# Altium footprint library ESP32-SIM800C_KIEN.PcbLib: 45 footprints (part 2 of 3)
Each footprint in its own frame and in the unit in brackets; x right, y up, seen from the top. Pads: shape width x height; smd on the part's side, far side on the other; paste and mask are expansions set on the pad; w line width, h text height; cw(c..) or ccw(c..) is an arc to the next point about the centre after c.
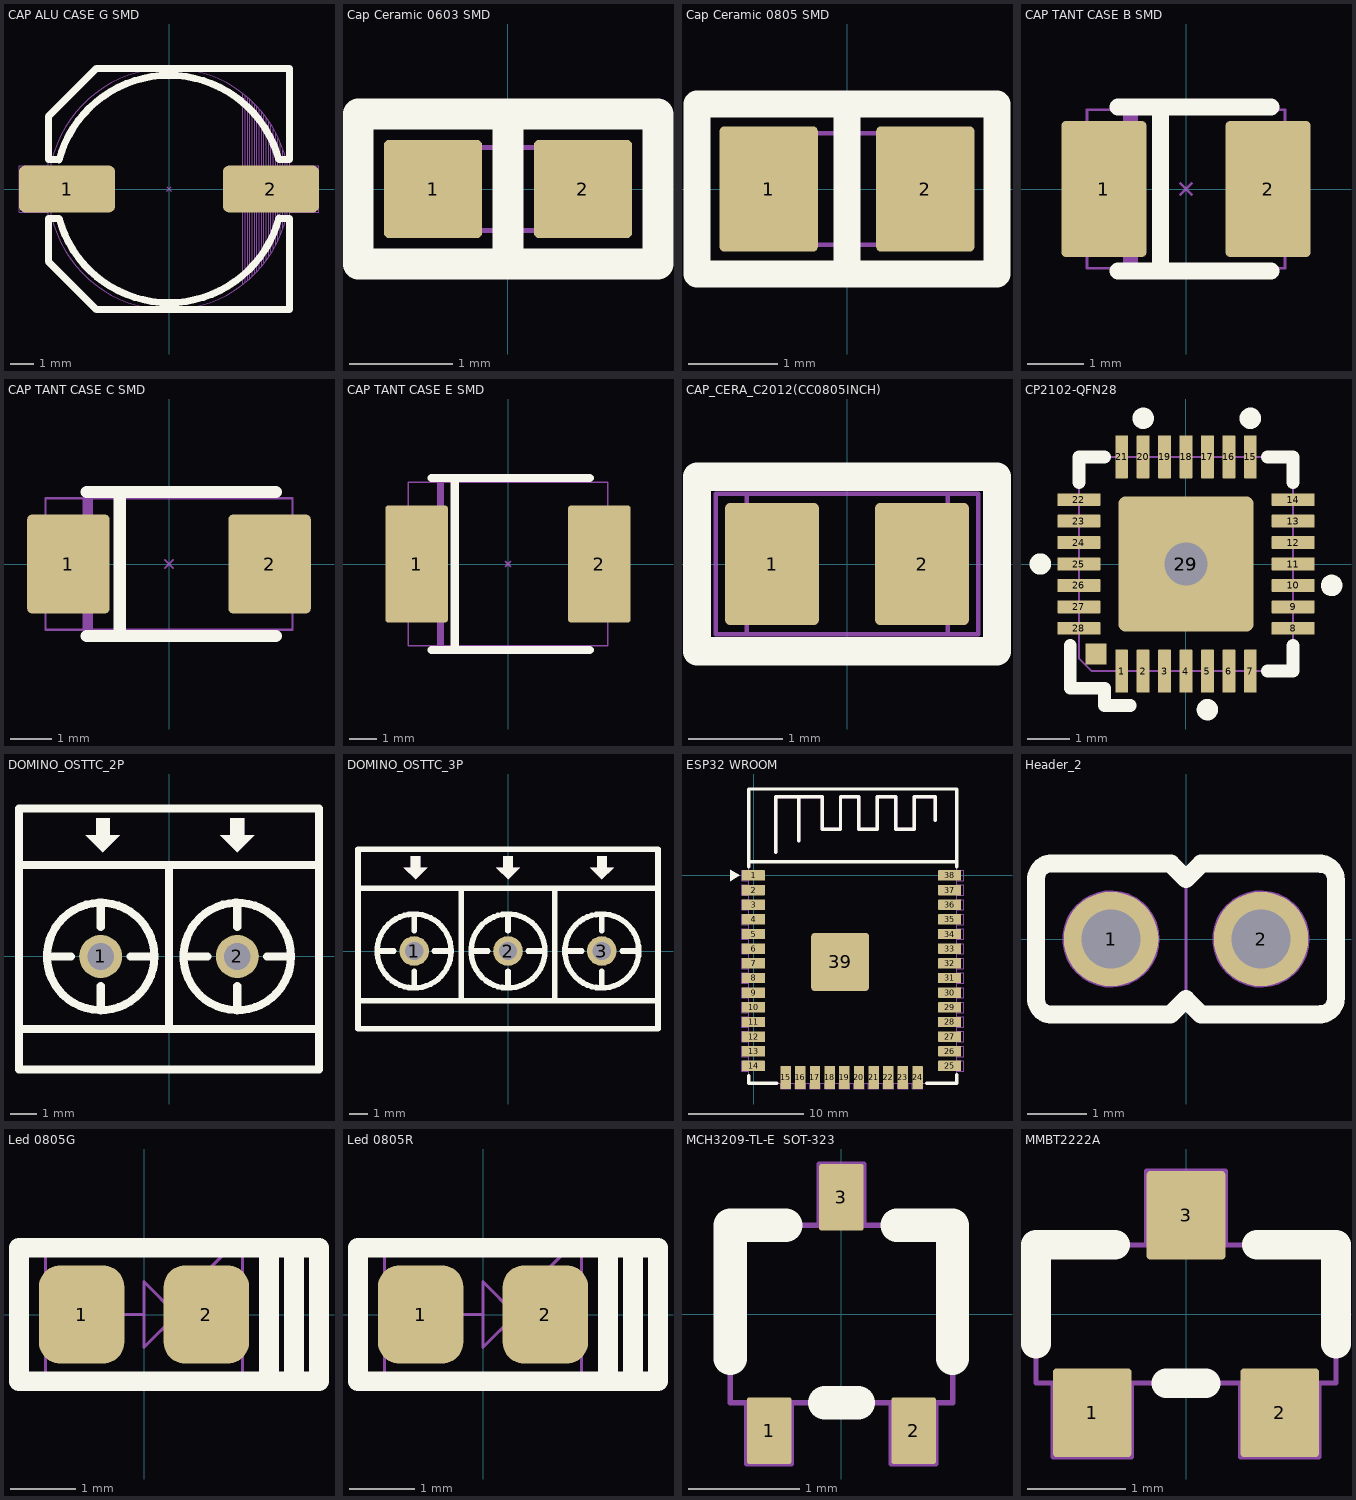
[diagram p1: the footprints below, top view; thin cyan lines are the x and y axes]

## CAP ALU CASE G SMD [mm]
pads (2):
  rrect25% 4.1x2 smd mask+0.05: 1(-4.35,0) 2(4.35,0)
Top Overlay:
  lines w0.3: -4.688,-1.25 -5.15,-1.25 -5.15,-3.1 -3.1,-5.15 5.15,-5.15 5.15,-1.25 4.688,-1.25 ; -4.688,1.25 -5.15,1.25 -5.15,3.1 -3.1,5.15 5.15,5.15 5.15,1.25 4.688,1.25 ; -4.687,1.248 cw(c0,0) 4.685,1.252 ; -4.685,-1.252 ccw(c0,0) 4.687,-1.248
Mechanical 2:
  circle w0.05: c0,0 r5.15
  lines w0.05: -5.95,0 -5.65,0 ; -5.8,-0.15 -5.8,0.15 ; -5.15,-1 -6.4,-1 -6.4,1 -5.15,1 ; -0.1,-0.1 0.1,0.1 ; -0.1,0.1 0.1,-0.1 ; 3.15,-4.05 3.15,4.05 ; 3.25,-3.95 3.25,3.95 ; 3.35,-3.9 3.35,3.9 ; 3.45,-3.8 3.45,3.8 ; 3.55,-3.7 3.55,3.7 ; 3.65,-3.6 3.65,3.6 ; 3.75,-3.5 3.75,3.5 ; 3.85,-3.4 3.85,3.4 ; 3.95,-3.3 3.95,3.3 ; 4.05,-3.15 4.05,3.15 ; 4.15,-3.05 4.15,3.05 ; 4.25,-2.9 4.25,2.9 ; 4.35,-2.7 4.35,2.75 ; 4.45,-2.55 4.45,2.55 ; 4.55,-2.4 4.55,2.35 ; 4.65,-2.2 4.65,2.15 ; 4.75,-1.95 4.75,1.95 ; 4.85,-1.7 4.85,1.65 ; 4.95,-1.35 4.95,1.35 ; 5.05,-0.9 5.05,0.85 ; 5.15,-1 6.4,-1 6.4,1 5.15,1 ; -5.15,-3.1 -5.15,3.1 -3.1,5.15 5.15,5.15 5.15,-5.15 -3.1,-5.15 -5.15,-3.1
  text ".Designator" at 0,0.1 h0.75
3D body "User Library-ALU-G.STEP": height 10.2, standoff 0, extent -5.8,-5.15 5.8,5.15
3D body "User Library-ALU-G.STEP": height 10.2, standoff 0, extent -5.72,-5.149 5.88,5.151

## Cap Ceramic 0603 SMD [mm] "Reflow Soldering"
pads (2):
  rrect10% 0.95x0.95 smd mask+0.05: 1(-0.725,0) 2(0.725,0)
Top Overlay:
  lines w0.3: -1.45,0.725 -1.45,-0.725 1.435,-0.725 ; -1.435,0.725 1.435,0.725 ; 0,-0.725 0,0.725 ; 1.45,-0.725 1.45,0.725
Mechanical 2:
  lines w0.05: -0.1,-0.1 0.1,0.1 ; -0.1,0.1 0.1,-0.1 ; -0.8,-0.4 0.8,-0.4 0.8,0.4 -0.8,0.4 -0.8,-0.4
  text ".Designator" at 0,0 h0.75
3D body "User Library-SMD CAPACITOR0603.STEP": height 0.85, standoff 0.05, extent -0.8,-0.4 0.8,0.4

## Cap Ceramic 0805 SMD [mm] "Reflow Soldering"
pads (2):
  rrect10% 1.1x1.4 smd mask+0.05: 1(-0.875,0) 2(0.875,0)
Top Overlay:
  lines w0.3: 0,-0.95 0,0.95 ; -1.675,-0.95 -1.675,0.95 1.675,0.95 1.675,-0.95 -1.675,-0.95
Mechanical 2:
  lines w0.05: -0.1,-0.1 0.1,0.1 ; -0.1,0.1 0.1,-0.1 ; -1,-0.625 1,-0.625 1,0.625 -1,0.625 -1,-0.625
  text ".Designator" at 0,0 h0.75
3D body "User Library-SMD CAPACITOR0805.STEP": height 0.65, standoff 0.05, extent -1,-0.625 1,0.625

## CAP TANT CASE B SMD [mm] "35x28mm"
height 2.1
pads (2):
  rrect10% 1.5x2.4 smd mask+0.05: 1(-1.45,0) 2(1.45,0)
Top Overlay:
  lines w0.3: -1.2,-1.45 1.5,-1.45 ; -1.2,1.45 1.5,1.45 ; -0.45,-1.45 -0.45,1.45
Mechanical 2:
  rectangle: -1.11,-1.4 -0.85,1.4
  lines w0.05: -1.5,0 -1.2,0 ; -1.35,-0.15 -1.35,0.15 ; -0.1,-0.1 0.1,0.1 ; -0.1,0.1 0.1,-0.1 ; -1.75,-1.4 1.75,-1.4 1.75,1.4 -1.75,1.4 -1.75,-1.4
  text ".Designator" at -0.1,0.1 h0.75
3D body "User Library-CaseB_3528-21.STEP": height 2, standoff 0.1, extent -1.75,-1.4 1.75,1.4

## CAP TANT CASE C SMD [mm] "60x32mm"
height 2.8
pads (2):
  rrect10% 2x2.4 smd mask+0.05: 1(-2.45,0) 2(2.45,0)
Top Overlay:
  lines w0.3: -2,-1.752 2.6,-1.752 ; -2,1.752 2.6,1.752 ; -1.2,-1.752 -1.2,1.752
Mechanical 2:
  rectangle: -2.11,-1.6 -1.85,1.6
  lines w0.05: -2.67,0 -2.37,0 ; -2.52,-0.15 -2.52,0.15 ; -0.1,-0.1 0.1,0.1 ; -0.1,0.1 0.1,-0.1 ; -3,-1.6 -3,1.6 3,1.6 3,-1.6 -3,-1.6
  text ".Designator" at -0.1,-0.1 h0.75
3D body "User Library-CaseC_6032-28.STEP": height 2.6, standoff 0.1, extent -2.995,-1.601 3.005,1.599

## CAP TANT CASE E SMD [mm] "73x60"
height 4.1
pads (2):
  rrect10% 2.3x4.3 smd mask+0.05: 1(-3.35,0) 2(3.35,0)
Top Overlay:
  lines w0.3: -2.8,-3.15 3,-3.15 ; -2.8,3.15 3,3.15 ; -1.95,-3.15 -1.95,3.15
Mechanical 2:
  rectangle: -2.61,-3 -2.35,3
  lines w0.05: -3.2,0 -2.9,0 ; -3.05,-0.15 -3.05,0.15 ; -0.1,-0.1 0.1,0.1 ; -0.1,0.1 0.1,-0.1 ; -3.65,-3 3.65,-3 3.65,3 -3.65,3 -3.65,-3
  text ".Designator" at 0,0 h0.75
3D body "User Library-CaseE_7260-38.STEP": height 3.6, standoff 0, extent -3.65,-3 3.65,3

## CAP_CERA_C2012(CC0805INCH) [mm] "Chip Capacitor, 2-Leads, Body 2.0x1.3mm, IPC Medium Density"
height 1.45
pads (2):
  rrect10% 1x1.3 smd mask+0.05: 1(-0.8,0) 2(0.8,0)
Top Overlay:
  lines w0.3: -1.6,-0.93 1.6,-0.93 1.6,0.93 -1.6,0.93 -1.6,-0.93
Mechanical 2:
  lines w0.05: -1.07,-0.74 -1.07,0.75 ; 1.075,-0.74 1.075,0.75 ; -1.4,-0.75 1.4,-0.75 1.4,0.75 -1.4,0.75 -1.4,-0.75
3D body "User Library-cap_0805_lowprofile.step": height 0.95, standoff 0, extent -1,-0.6 1,0.6

## CP2102-QFN28 [mm] "QFN28 5x5 pitch 0.5"
height 1
pads (31):
  rrect10% 0.3x1 smd mask+0.05: 1(-1.5,-2.5) 2(-1,-2.5) 3(-0.5,-2.5) 4(0,-2.5) 5(0.5,-2.5) 6(1,-2.5) 7(1.5,-2.5) 15(1.5,2.5) 16(1,2.5) 17(0.5,2.5) 18(0,2.5) 19(-0.5,2.5) 20(-1,2.5) 21(-1.5,2.5)
  rrect10% 1x0.3 smd mask+0.05: 8(2.5,-1.5) 9(2.5,-1) 10(2.5,-0.5) 11(2.5,0) 12(2.5,0.5) 13(2.5,1) 14(2.5,1.5) 22(-2.5,1.5) 23(-2.5,1) 24(-2.5,0.5) 25(-2.5,0) 26(-2.5,-0.5) 27(-2.5,-1) 28(-2.5,-1.5)
  round 1.4 hole 1 mask+0.05: 29(0,0)
  rrect10% 3.15x3.15 smd mask+0.05: 29(0,0)
  rrect10% 0.5x0.5 smd mask+0.05: ""(-2.1,-2.1)
Top Overlay:
  circle w0.3: c0.5,-3.4 r0.1
  circle w0.3: c3.4,-0.5 r0.1
  circle w0.3: c1.5,3.4 r0.1
  circle w0.3: c-1,3.4 r0.1
  circle w0.3: c-3.4,0 r0.1
  lines w0.3: -2.7,-1.9 -2.7,-2.9 -1.9,-2.9 -1.9,-3.3 -1.3,-3.3 ; -2.5,1.9 -2.5,2.5 -1.9,2.5 ; 1.9,-2.5 2.5,-2.5 2.5,-1.9 ; 1.9,2.5 2.5,2.5 2.5,1.9
Mechanical 2:
  lines w0.05: -2.5,-2.2 -2.5,2.3 -2.3,2.5 2.3,2.5 2.5,2.3 2.5,-2.3 2.3,-2.5 -2.2,-2.5 -2.5,-2.2
  text "28" at -1.7,-1.8 h0.75
  text "22" at -1.6,0.7 h0.75
  text "21" at -1.7,1.7 h0.75
  text "15" at 1,1.7 h0.75
  text "14" at 2.1,0.6 h0.75
  text "8" at 2.2,-1.7 h0.75
  text "7" at 1.3,-2.3 h0.75
  text "1" at -1.5,-2.3 h0.75
3D body "User Library-QFN28-0_5.STEP": height 1, standoff 0, extent -2.5,-2.5 2.5,2.5

## DOMINO_OSTTC_2P [mm] "15A PIN TO PIN 5.08MM ED2609-ND"
pads (2):
  round 1.6 hole 1 mask+0.05: 1(-2.54,0) 2(2.54,0)
Top Overlay:
  circle w0.3: c-2.54,0 r2
  circle w0.3: c2.54,0 r2
  region: 2.54,3.871 1.905,4.506 2.286,4.506 2.286,5.141 2.794,5.141 2.794,4.506 3.175,4.506
  region: -2.46,3.871 -3.095,4.506 -2.714,4.506 -2.714,5.141 -2.206,5.141 -2.206,4.506 -1.825,4.506
  lines w0.3: -5.58,-4.2 -5.58,5.5 ; -5.5,-4.2 5.5,-4.2 ; -5.5,-2.7 5.5,-2.7 ; -5.5,3.4 5.5,3.4 ; -5.5,5.5 5.5,5.5 ; -4.54,0 -3.64,0 ; -2.54,-2 -2.54,-1.1 ; -2.54,1.1 -2.54,2 -2.5,2 ; -1.44,0 -0.54,0 ; 0,-2.7 0,3.4 ; 0.54,0 1.44,0 ; 2.54,-2 2.54,-1.1 ; 2.54,1.1 2.54,2 ; 3.64,0 4.54,0 ; 5.58,-4.2 5.58,5.5
Mechanical 2:
  circle w0.05: c2.54,0 r2
  circle w0.05: c-2.54,0 r2
  region: 2.54,3.871 1.905,4.506 2.286,4.506 2.286,5.141 2.794,5.141 2.794,4.506 3.175,4.506
  region: -2.46,3.871 -3.095,4.506 -2.714,4.506 -2.714,5.141 -2.206,5.141 -2.206,4.506 -1.825,4.506
  lines w0.05: -5.5,-2.7 5.5,-2.7 ; -5.5,3.4 5.5,3.4 ; 0,-2.7 0,3.4 ; -5.5,-4.2 -5.5,5.5 5.5,5.5 5.5,-4.2 -5.5,-4.2
  text "2" at 2.14,-0.6 h0.75
  text "1" at -2.74,-0.6 h0.75
3D body "STB01.step": height 12.5, standoff -4.4, extent -0.34,-3.753 5.34,5.247
3D body "STB01.step": height 12.5, standoff -4.4, extent -5.42,-3.753 0.26,5.247

## DOMINO_OSTTC_3P [mm] "15A PIN TO PIN 5.08MM ED2610-ND"
pads (3):
  round 1.6 hole 1 mask+0.05: 1(-5.08,0) 2(0,0) 3(5.08,0)
Top Overlay:
  circle w0.3: c5.08,0 r2
  circle w0.3: c0,0 r2
  circle w0.3: c-5.08,0 r2
  region: 5.08,3.871 4.445,4.506 4.826,4.506 4.826,5.141 5.334,5.141 5.334,4.506 5.715,4.506
  region: -5,3.871 -5.635,4.506 -5.254,4.506 -5.254,5.141 -4.746,5.141 -4.746,4.506 -4.365,4.506
  region: 0,3.871 -0.635,4.506 -0.254,4.506 -0.254,5.141 0.254,5.141 0.254,4.506 0.635,4.506
  lines w0.3: -8.12,-4.2 -8.12,5.5 ; -8.04,-4.2 8.12,-4.2 8.12,5.5 ; -8.04,-2.7 8.092,-2.7 ; -8.04,3.4 8.117,3.4 ; -8.04,5.5 8.04,5.5 ; -7.08,0 -6.18,0 ; -5.08,-2 -5.08,-1.1 ; -5.08,1.1 -5.08,2 -5.04,2 ; -3.98,0 -3.08,0 ; -2.54,-2.7 -2.54,3.4 ; -2,0 -1.1,0 ; 0,-2 0,-1.1 ; 0,1.1 0,2 ; 1.1,0 2,0 ; 2.54,-2.7 2.54,3.4 ; 3.08,0 3.98,0 ; 5.08,-2 5.08,-1.1 ; 5.08,1.1 5.08,2 ; 6.18,0 7.08,0
Mechanical 2:
  circle w0.05: c5.08,0 r2
  circle w0.05: c-5.08,0 r2
  circle w0.05: c0,0 r2
  region: 5.08,3.871 4.445,4.506 4.826,4.506 4.826,5.141 5.334,5.141 5.334,4.506 5.715,4.506
  region: -5,3.871 -5.635,4.506 -5.254,4.506 -5.254,5.141 -4.746,5.141 -4.746,4.506 -4.365,4.506
  region: 0,3.871 -0.635,4.506 -0.254,4.506 -0.254,5.141 0.254,5.141 0.254,4.506 0.635,4.506
  lines w0.05: -8.04,-2.7 8.016,-2.7 ; -8.04,3.4 8.04,3.4 ; -2.54,-2.7 -2.54,3.4 ; 2.54,-2.7 2.54,3.4 ; -8.04,-4.2 8.04,-4.2 8.04,5.5 -8.04,5.5 -8.04,-4.2
  text "3" at 4.68,-0.6 h0.75
  text "1" at -5.28,-0.6 h0.75
  text "2" at -0.4,-0.6 h0.75
3D body "STB01.step": height 12.5, standoff -4.4, extent 2.2,-3.753 7.88,5.247
3D body "STB01.step": height 12.5, standoff -4.4, extent -7.96,-3.753 -2.28,5.247
3D body "STB01.step": height 12.5, standoff -4.4, extent -2.88,-3.753 2.8,5.247

## ESP32 WROOM [mm] "ESP32 WROOM"
pads (39):
  rrect10% 2x0.9 smd mask+0.05: 1(0,0) 2(0,-1.27) 3(0,-2.54) 4(0,-3.81) 5(0,-5.08) 6(0,-6.35) 7(0,-7.62) 8(0,-8.89) 9(0,-10.16) 10(0,-11.43) 11(0,-12.7) 12(0,-13.97) 13(0,-15.24) 14(0,-16.51) 25(17,-16.51) 26(17,-15.24) 27(17,-13.97) 28(17,-12.7) 29(17,-11.43) 30(17,-10.16) 31(17,-8.89) 32(17,-7.62) 33(17,-6.35) 34(17,-5.08) 35(17,-3.81) 36(17,-2.54) 37(17,-1.27) 38(17,0)
  rrect10% 0.9x2 smd mask+0.05: 15(2.785,-17.51) 16(4.055,-17.51) 17(5.325,-17.51) 18(6.595,-17.51) 19(7.865,-17.51) 20(9.135,-17.51) 21(10.405,-17.51) 22(11.675,-17.51) 23(12.945,-17.51) 24(14.215,-17.51)
  rrect10% 5x5 smd mask+0.05: 39(7.5,-7.5)
Top Overlay:
  region: -1.2,0 -2,0.5 -2,-0.5
  lines w0.3: -0.4,-17.355 -0.4,-18.015 2,-18.015 ; -0.4,0.745 -0.4,7.49 17.6,7.49 17.6,0.745 ; -0.4,1.19 17.6,1.19 ; 1.935,2 1.935,6.8 5.935,6.8 5.935,4 7.535,4 7.535,6.8 9.135,6.8 9.135,6.4 9.135,4 10.735,4 10.735,6.8 12.335,6.8 12.335,4 13.935,4 13.935,6.8 15.735,6.8 15.735,4.8 ; 3.935,3 3.935,6.8 ; 15,-18.015 17.6,-18.015 17.6,-17.255
Mechanical 2:
  drawing of 167 lines, arcs and shapes, not listed
  text "1" at 0.6,-0.055 h0.75
  text "14" at 0.6,-16.955 h0.75
  text "15" at 2.2,-17.555 h0.75
  text "24" at 13.6,-17.555 h0.75
  text "25" at 17.3,-17.155 h0.75
  text "38" at 17.3,-0.555 h0.75
3D body "esp-wroom-32.stp": height 3, standoff -0.04, extent -0.535,-18.015 17.535,7.525

## Header_2 [mm] "Connector DIP, 2Pin_2.54mm"
height 5
pads (2):
  round 1.6 hole 1 mask+0.05: 1(-1.27,0) 2(1.27,0)
Top Overlay:
  lines w0.3: -0.264,-1.28 -2.3,-1.28 cw(c-2.28,-1.02) -2.54,-1 -2.54,1 cw(c-2.28,1.02) -2.3,1.28 -0.254,1.28 ; -0.254,-1.27 0,-1.016 0,-1.026 0.254,-1.28 2.286,-1.28 2.286,-1.27 ; -0.254,1.27 0,1.016 0.254,1.27 ; 0.254,1.28 2.286,1.28 2.286,1.27 ; 2.26,-1.28 ccw(c2.26,-1) 2.54,-1 2.54,1 ccw(c2.26,1) 2.26,1.28
Mechanical 1:
  circle w0.05: c1.27,0 r0.8
  circle w0.05: c-1.27,0 r0.8
  lines w0.05: -0.264,-1.28 -2.3,-1.28 cw(c-2.28,-1.02) -2.54,-1 -2.54,1 cw(c-2.28,1.02) -2.3,1.28 -0.254,1.28 ; -0.254,-1.27 0,-1.016 0,-1.026 ; -0.254,1.27 0,1.016 ; 0.254,1.27 0,1.016 ; 0.254,1.28 2.286,1.28 2.286,1.27 ; 2.26,-1.28 ccw(c2.26,-1) 2.54,-1 2.54,1 ccw(c2.26,1) 2.26,1.28 ; 2.286,-1.27 2.286,-1.28 0.254,-1.28 0,-1.026 ; 0,-1.026 0,1.016
  text "1" at -1.524,-0.254 h0.75
  text "2" at 1.016,-0.254 h0.75
  text "HD?" at 0.05,0.05 h0.75
3D body "Header 1x2.STEP": height 10.1, standoff -1.5, extent -2.54,-1.27 2.54,1.27

## Led 0805G [mm] "Chip LED; Green; Body 2.0 x 1.3 mm (LxW typ)"
height 1.1
pads (2):
  rrect50% 1.3x1.5 smd mask+0.05: 1(-0.95,0) 2(0.95,0)
Top Overlay:
  lines w0.3: 1.905,-1.016 1.905,1.016 ; 2.286,-1.016 2.286,1.016 ; -1.905,-1.016 2.667,-1.016 2.667,1.016 -1.905,1.016 -1.905,-1.016
Mechanical 2:
  lines w0.05: -1.5,-1 -1.5,1.032 ; -0.5,0 0,0 ; 0.5,-0.5 0.5,0.5 ; 0.6,0.5 0.8,0.7 0.8,0.5 1.2,0.9 ; 0.75,0.2 0.95,0.4 0.95,0.2 1.35,0.6 ; 1,0 0.5,0 ; 1.5,-1 1.5,1.032 ; 0.5,0 0,0.5 0,-0.5 0.5,0 ; -1.905,-1 1.905,-1 1.905,1.032 -1.905,1.032 -1.905,-1
3D body "User Library-User Library-led_0805 GRE.step": height 1.1, standoff 0, extent -1.035,-0.625 0.985,0.625

## Led 0805R [mm] "Chip LED; RED ; Body 2.0 x 1.3 mm (LxW typ)"
height 1.1
pads (2):
  rrect50% 1.3x1.5 smd mask+0.05: 1(-0.95,0) 2(0.95,0)
Top Overlay:
  lines w0.3: 1.905,-1.016 1.905,1.016 ; 2.286,-1.016 2.286,1.016 ; -1.905,-1.016 -1.905,1.016 2.667,1.016 2.667,-1.016 -1.905,-1.016
Mechanical 1:
  lines w0.05: -1.5,-1 -1.5,1.032 ; -0.5,0 0,0 ; 0.5,-0.5 0.5,0.5 ; 0.6,0.5 0.8,0.7 0.8,0.5 1.2,0.9 ; 0.75,0.2 0.95,0.4 0.95,0.2 1.35,0.6 ; 1,0 0.5,0 ; 1.5,-1 1.5,1.032 ; 0.5,0 0,-0.5 0,0.5 0.5,0 ; -1.905,-1 1.905,-1 1.905,1.032 -1.905,1.032 -1.905,-1
3D body "User Library-User Library-led_0805 R.step": height 1.1, standoff 0, extent -1.01,-0.625 1.01,0.625

## MCH3209-TL-E  SOT-323 [mm] "TRANS NPN 30V 3A MCPH3  SOT-323"
height 0.9
pads (3):
  rrect10% 0.4x0.6 smd mask+0.05: 1(-0.65,-1.05) 2(0.65,-1.05) 3(0,1.05)
Top Overlay:
  lines w0: 1,-0.4 1.1,-0.4
  lines w0.3: -1,-0.4 -1,0.8 -0.5,0.8 ; -0.15,-0.8 0.15,-0.8 ; 0.5,0.8 1,0.8 1,-0.4
Mechanical 2:
  lines w0.05: -0.851,-0.802 -0.851,-1.347 -0.45,-1.347 -0.45,-0.801 ; -0.201,0.801 -0.2,0.801 -0.2,1.347 0.201,1.347 0.201,0.802 0.204,0.802 ; 0.449,-0.802 0.449,-1.347 0.85,-1.347 0.85,-0.801 ; -1,-0.8 -1,0.8 1,0.8 1,-0.8 -1,-0.8
  text "E" at 0.55,-0.65 h0.75
  text "C" at -0.15,0.2 h0.75
  text "B" at -0.85,-0.65 h0.75
3D body "User Library-sc70-3.step": height 0.9, standoff -0.1, extent -1.05,-1.15 1.05,1.15

## MMBT2222A [mm] "SOT-23"
height 1.11
pads (3):
  rrect10% 0.8x0.9 smd mask+0.05: 1(-0.95,-1) 2(0.95,-1) 3(0,1)
Top Overlay:
  lines w0.3: -1.52,-0.3 -1.52,0.7 -0.72,0.7 ; -0.2,-0.7 0.2,-0.7 ; 0.72,0.7 1.52,0.7 1.52,-0.3
Mechanical 1:
  lines w0.05: -1.35,-0.7 -0.55,-0.7 ; -1.35,-0.7 -1.35,-1.45 -0.55,-1.45 -0.55,-0.7 ; -1.35,-0.7 -1.52,-0.7 -1.52,0.7 -0.4,0.7 ; -0.55,-0.7 0.55,-0.7 ; -0.4,0.7 0.4,0.7 ; -0.4,0.7 -0.4,1.45 0.4,1.45 0.4,0.7 ; 0.4,0.7 1.52,0.7 1.52,-0.7 1.35,-0.7 ; 0.55,-0.7 1.35,-0.7 ; 0.55,-0.7 0.55,-1.45 1.35,-1.45 1.35,-0.7
  text "Q?" at -0.03,0 h0.75
  text "B" at -1.05,-1.3 h0.75
  text "E" at 0.85,-1.3 h0.75
  text "C" at -0.15,0.9 h0.75